# Altium footprint library Footprints_SOC.PcbLib: 194 footprints (part 3 of 13)
Each footprint in its own frame and in the unit in brackets; x right, y up, seen from the top. Pads: shape width x height; smd on the part's side, far side on the other; paste and mask are expansions set on the pad; w line width, h text height; cw(c..) or ccw(c..) is an arc to the next point about the centre after c.
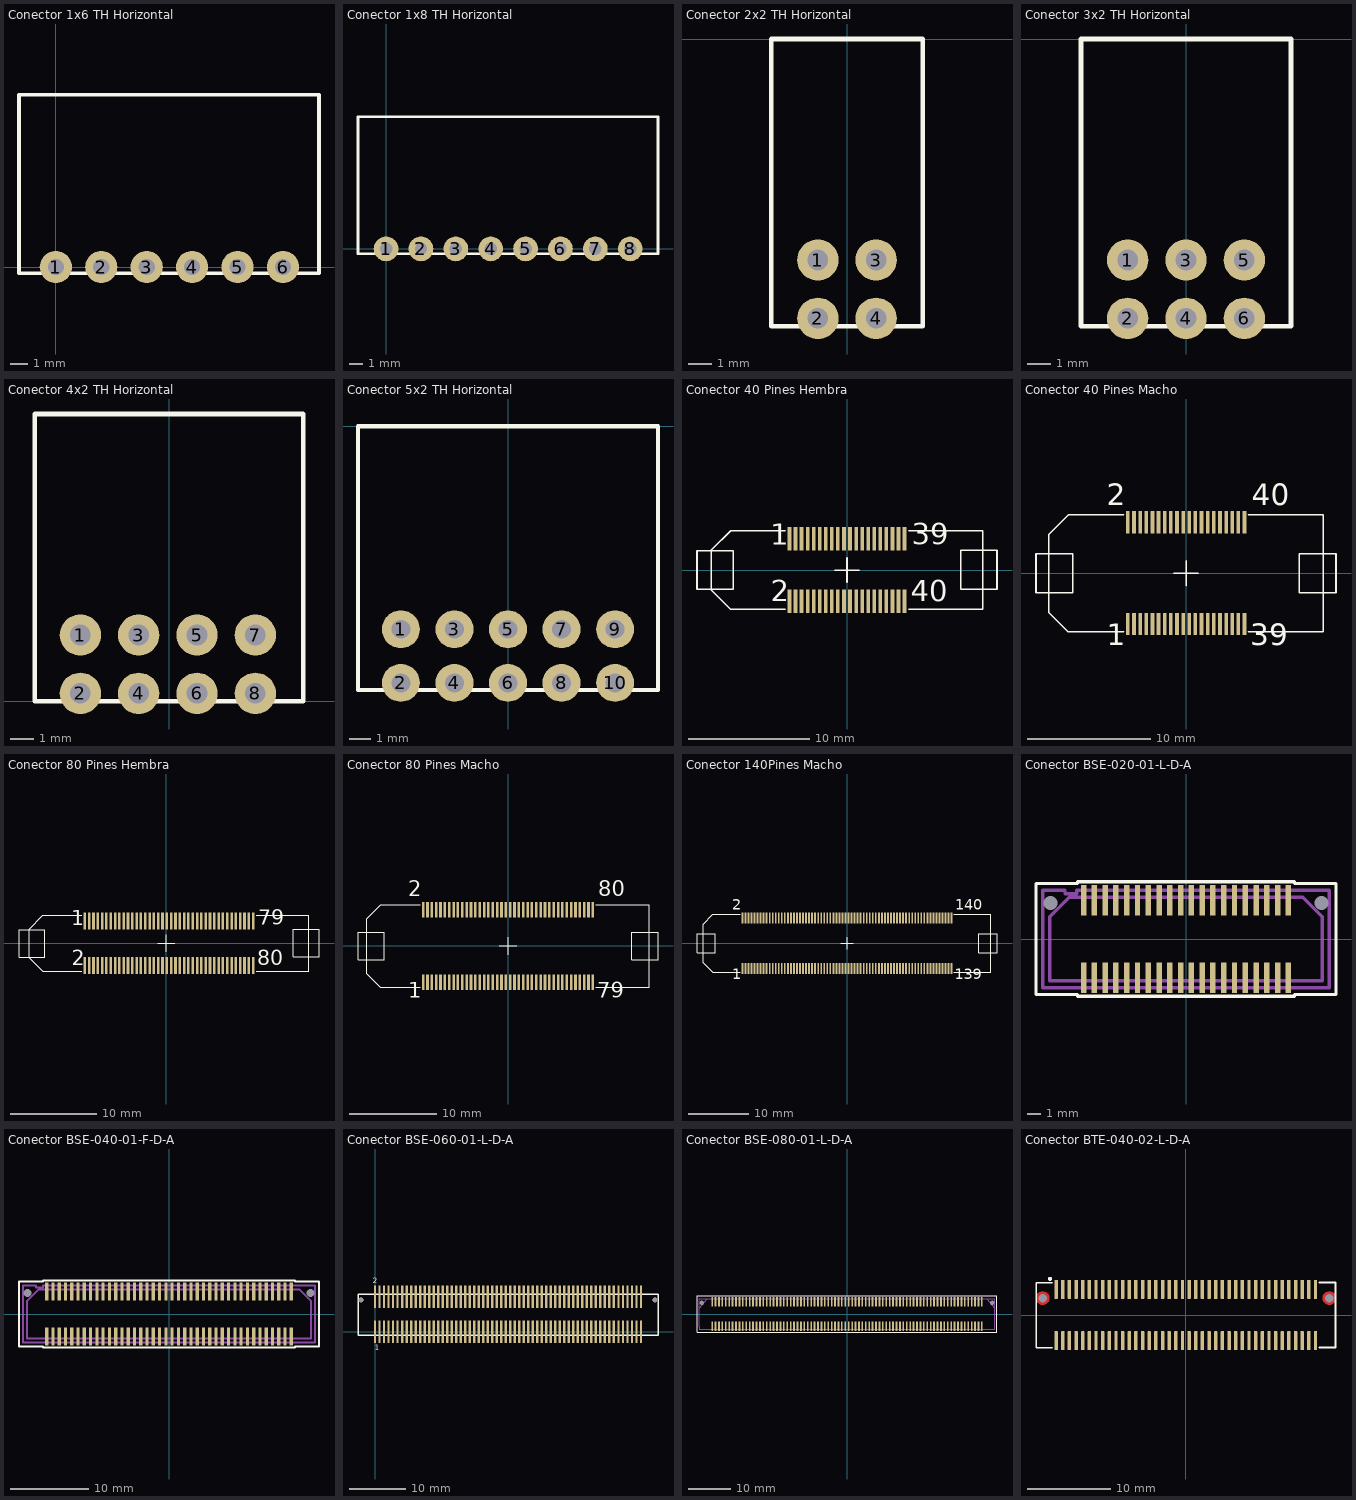
[diagram p2: the footprints below, top view; thin cyan lines are the x and y axes]

## Conector 1x6 TH Horizontal [mm] "Pitch 2.54mm P/N: IPL1-106-01-L-S-RA-K"
pads (6):
  round 1.8 hole 0.9 unplated: 1(0,0) 2(2.54,0) 3(5.08,0) 4(7.62,0) 5(10.16,0) 6(12.7,0)
Top Overlay:
  lines w0.2: -2.06,-0.345 -2.06,9.625 14.712,9.625 14.712,-0.345 -2.06,-0.345
3D body "Conector 1x6 TH Horizontal - IPL1-106-01-L-S-RA-K.stp": height 7.06, standoff -1.71, extent -2.052,-0.301 14.712,9.668

## Conector 1x8 TH Horizontal [mm] "Pitch 2.54mm P/N: IPL1-108-01-L-S-RA-K"
pads (8):
  round 1.8 hole 0.9 unplated: 1(0,0) 2(2.54,0) 3(5.08,0) 4(7.62,0) 5(10.16,0) 6(12.7,0) 7(15.24,0) 8(17.78,0)
Top Overlay:
  lines w0.2: -2.044,-0.345 -2.044,9.625 19.8,9.625 19.8,-0.345 -2.044,-0.345
3D body "Conector 1x8 TH Horizontal - IPL1-108-01-L-S-RA-K.stp": height 7.06, standoff -1.71, extent -2.044,-0.345 19.8,9.625

## Conector 2x2 TH Horizontal [mm] "Pitch 2.54mm P/N: IPL1-102-01-L-D-RA-K"
pads (4):
  round 1.8 hole 0.9: 1(-1.27,-9.628) 2(-1.27,-12.168) 3(1.27,-9.628) 4(1.27,-12.168)
Top Overlay:
  lines w0.2: -3.302,-12.509 3.302,-12.509 3.302,0 -3.302,0 -3.302,-12.509
3D body "Conector 2x2 TH Horizontal - IPL1-102-01-L-D-RA-K.stp": height 8.19, standoff -1.84, extent -3.302,-12.509 3.302,0

## Conector 3x2 TH Horizontal [mm] "Pitch 2.54mm P/N: IPL1-103-01-L-D-RA-K"
pads (6):
  round 1.8 hole 0.9: 1(-2.54,-9.628) 2(-2.54,-12.168) 3(0,-9.628) 4(0,-12.168) 5(2.54,-9.628) 6(2.54,-12.168)
Top Overlay:
  lines w0.2: -4.572,-12.509 -4.572,0 4.572,0 4.572,-12.509 -4.572,-12.509
3D body "Conector 3x2 TH Horizontal - IPL1-103-01-L-D-RA-K.stp": height 8.19, standoff -1.84, extent -4.572,-12.509 4.572,0

## Conector 4x2 TH Horizontal [mm] "Pitch 2.54mm P/N: IPL1-104-01-L-D-RA-K"
pads (8):
  round 1.8 hole 0.9: 1(-3.86,2.881) 2(-3.86,0.341) 3(-1.32,2.881) 4(-1.32,0.341) 5(1.22,2.881) 6(1.22,0.341) 7(3.76,2.881) 8(3.76,0.341)
Top Overlay:
  lines w0.2: -5.842,0 -5.842,12.509 5.842,12.509 5.842,0 -5.842,0
3D body "Conector 4x2 TH Horizontal - IPL1-104-01-L-D-RA-K.stp": height 8.19, standoff -1.84, extent -5.842,0 5.842,12.509

## Conector 5x2 TH Horizontal [mm] "Pitch 2.54mm P/N: IPL1-105-01-L-D-RA-K"
pads (10):
  round 1.8 hole 0.9 unplated: 1(-5.08,-9.628) 2(-5.08,-12.168) 3(-2.54,-9.628) 4(-2.54,-12.168) 5(0,-9.628) 6(0,-12.168) 7(2.54,-9.628) 8(2.54,-12.168) 9(5.08,-9.628) 10(5.08,-12.168)
Top Overlay:
  lines w0.2: -7.112,-12.509 7.112,-12.509 7.112,0 -7.112,0 -7.112,-12.509
3D body "Conector 5x2 TH Horizontal - IPL1-105-01-L-D-RA-K.stp": height 8.19, standoff -1.84, extent -7.112,-12.509 7.112,0

## Conector 40 Pines Hembra [mm] "SMD pitch 0.5mm 2 filas"
pads (40):
  rect 0.3x1.95 smd: 1(-4.75,2.575) 2(-4.75,-2.575) 3(-4.25,2.575) 4(-4.25,-2.575) 5(-3.75,2.575) 6(-3.75,-2.575) 7(-3.25,2.575) 8(-3.25,-2.575) 9(-2.75,2.575) 10(-2.75,-2.575) 11(-2.25,2.575) 12(-2.25,-2.575) 13(-1.75,2.575) 14(-1.75,-2.575) 15(-1.25,2.575) 16(-1.25,-2.575) 17(-0.75,2.575) 18(-0.75,-2.575) 19(-0.25,2.575) 20(-0.25,-2.575) 21(0.25,2.575) 22(0.25,-2.575) 23(0.75,2.575) 24(0.75,-2.575) 25(1.25,2.575) 26(1.25,-2.575) 27(1.75,2.575) 28(1.75,-2.575) 29(2.25,2.575) 30(2.25,-2.575) 31(2.75,2.575) 32(2.75,-2.575) 33(3.25,2.575) 34(3.25,-2.575) 35(3.75,2.575) 36(3.75,-2.575) 37(4.25,2.575) 38(4.25,-2.575) 39(4.75,2.575) 40(4.75,-2.575)
Top Overlay:
  lines w0.127: -5.1,-3.25 -9.6,-3.25 -11.2,-1.65 -11.2,1.649 -9.6,3.25 -5.1,3.25 ; -1,0 1,0 ; 0,-1 0,1 ; 5.1,-3.25 11.2,-3.25 11.2,3.25 5.1,3.25 ; -12.38,-1.6 -9.38,-1.6 -9.38,1.6 -12.38,1.6 -12.38,-1.6 ; 9.38,-1.58 9.38,1.62 12.38,1.62 12.38,-1.58 9.38,-1.58
  text "39" at 5.35,1.55 h3
  text "40" at 5.25,-3.138 h3
  text "2" at -6.28,-3.138 h3
  text "1" at -6.33,1.523 h3
  text "." at -5.53,3.54 h3
3D body "FX20-40S-0.5SV.stp": height 8.3, standoff 0, extent -11.185,-3.4 11.215,3.4

## Conector 40 Pines Macho [mm] "SMD pitch 0.5mm 2 filas"
pads (40):
  rect 0.3x1.8 smd: 1(-4.75,-4.15) 2(-4.75,4.15) 3(-4.25,-4.15) 4(-4.25,4.15) 5(-3.75,-4.15) 6(-3.75,4.15) 7(-3.25,-4.15) 8(-3.25,4.15) 9(-2.75,-4.15) 10(-2.75,4.15) 11(-2.25,-4.15) 12(-2.25,4.15) 13(-1.75,-4.15) 14(-1.75,4.15) 15(-1.25,-4.15) 16(-1.25,4.15) 17(-0.75,-4.15) 18(-0.75,4.15) 19(-0.25,-4.15) 20(-0.25,4.15) 21(0.25,-4.15) 22(0.25,4.15) 23(0.75,-4.15) 24(0.75,4.15) 25(1.25,-4.15) 26(1.25,4.15) 27(1.75,-4.15) 28(1.75,4.15) 29(2.25,-4.15) 30(2.25,4.15) 31(2.75,-4.15) 32(2.75,4.15) 33(3.25,-4.15) 34(3.25,4.15) 35(3.75,-4.15) 36(3.75,4.15) 37(4.25,-4.15) 38(4.25,4.15) 39(4.75,-4.15) 40(4.75,4.15)
Top Overlay:
  lines w0.127: -5.1,-4.75 -9.65,-4.75 -11.2,-3.2 -11.2,3.15 -9.6,4.75 -5.1,4.75 ; -1,0 1,0 ; 0,-1 0,1 ; 5.07,-4.75 11.17,-4.75 11.17,4.75 5.07,4.75 ; -12.23,-1.6 -9.23,-1.6 -9.23,1.6 -12.23,1.6 -12.23,-1.6 ; 9.2,-1.6 9.2,1.6 12.2,1.6 12.2,-1.6 9.2,-1.6
  text "40" at 5.32,4.95 h3
  text "39" at 5.22,-6.45 h3
  text "2" at -6.45,4.95 h3
  text "1" at -6.45,-6.45 h3
  text "." at -5.53,-5.25 h3
3D body "FX20-40P-0.5SV15.stp": height 13.2, standoff 0, extent -11.2,-4.75 11.2,4.75

## Conector 80 Pines Hembra [mm] "SMD pitch 0.5mm 2 filas"
pads (80):
  rect 0.3x1.95 smd: 1(-9.42,2.575) 2(-9.42,-2.575) 3(-8.92,2.575) 4(-8.92,-2.575) 5(-8.42,2.575) 6(-8.42,-2.575) 7(-7.92,2.575) 8(-7.92,-2.575) 9(-7.42,2.575) 10(-7.42,-2.575) 11(-6.92,2.575) 12(-6.92,-2.575) 13(-6.42,2.575) 14(-6.42,-2.575) 15(-5.92,2.575) 16(-5.92,-2.575) 17(-5.42,2.575) 18(-5.42,-2.575) 19(-4.92,2.575) 20(-4.92,-2.575) 21(-4.42,2.575) 22(-4.42,-2.575) 23(-3.92,2.575) 24(-3.92,-2.575) 25(-3.42,2.575) 26(-3.42,-2.575) 27(-2.92,2.575) 28(-2.92,-2.575) 29(-2.42,2.575) 30(-2.42,-2.575) 31(-1.92,2.575) 32(-1.92,-2.575) 33(-1.42,2.575) 34(-1.42,-2.575) 35(-0.92,2.575) 36(-0.92,-2.575) 37(-0.42,2.575) 38(-0.42,-2.575) 39(0.08,2.575) 40(0.08,-2.575) 41(0.58,2.575) 42(0.58,-2.575) 43(1.08,2.575) 44(1.08,-2.575) 45(1.58,2.575) 46(1.58,-2.575) 47(2.08,2.575) 48(2.08,-2.575) 49(2.58,2.575) 50(2.58,-2.575) 51(3.08,2.575) 52(3.08,-2.575) 53(3.58,2.575) 54(3.58,-2.575) 55(4.08,2.575) 56(4.08,-2.575) 57(4.58,2.575) 58(4.58,-2.575) 59(5.08,2.575) 60(5.08,-2.575) 61(5.58,2.575) 62(5.58,-2.575) 63(6.08,2.575) 64(6.08,-2.575) 65(6.58,2.575) 66(6.58,-2.575) 67(7.08,2.575) 68(7.08,-2.575) 69(7.58,2.575) 70(7.58,-2.575) 71(8.08,2.575) 72(8.08,-2.575) 73(8.58,2.575) 74(8.58,-2.575) 75(9.08,2.575) 76(9.08,-2.575) 77(9.58,2.575) 78(9.58,-2.575) 79(10.08,2.575) 80(10.08,-2.575)
Top Overlay:
  lines w0.127: -9.77,-3.25 -14.27,-3.25 -15.87,-1.65 -15.87,1.649 -14.27,3.25 -9.77,3.25 ; -1,0 1,0 ; 0.003,-1 0.003,1 ; 10.43,-3.25 16.53,-3.25 16.53,3.25 10.43,3.25 ; -17.05,-1.6 -17.05,1.6 -14.05,1.6 -14.05,-1.6 -17.05,-1.6 ; 14.71,-1.58 17.71,-1.58 17.71,1.62 14.71,1.62 14.71,-1.58
  text "." at -10.2,3.54 h3
  text "1" at -11,1.523 h3
  text "2" at -10.95,-3.138 h3
  text "80" at 10.58,-3.138 h3
  text "79" at 10.68,1.55 h3
3D body "FX20-80S-0.5SV.stp": height 8.3, standoff 0, extent -15.87,-3.4 16.53,3.4

## Conector 80 Pines Macho [mm] "SMD pitch 0.5mm 2 filas"
pads (80):
  rect 0.3x1.8 smd: 1(-9.75,-4.15) 2(-9.75,4.15) 3(-9.25,-4.15) 4(-9.25,4.15) 5(-8.75,-4.15) 6(-8.75,4.15) 7(-8.25,-4.15) 8(-8.25,4.15) 9(-7.75,-4.15) 10(-7.75,4.15) 11(-7.25,-4.15) 12(-7.25,4.15) 13(-6.75,-4.15) 14(-6.75,4.15) 15(-6.25,-4.15) 16(-6.25,4.15) 17(-5.75,-4.15) 18(-5.75,4.15) 19(-5.25,-4.15) 20(-5.25,4.15) 21(-4.75,-4.15) 22(-4.75,4.15) 23(-4.25,-4.15) 24(-4.25,4.15) 25(-3.75,-4.15) 26(-3.75,4.15) 27(-3.25,-4.15) 28(-3.25,4.15) 29(-2.75,-4.15) 30(-2.75,4.15) 31(-2.25,-4.15) 32(-2.25,4.15) 33(-1.75,-4.15) 34(-1.75,4.15) 35(-1.25,-4.15) 36(-1.25,4.15) 37(-0.75,-4.15) 38(-0.75,4.15) 39(-0.25,-4.15) 40(-0.25,4.15) 41(0.25,-4.15) 42(0.25,4.15) 43(0.75,-4.15) 44(0.75,4.15) 45(1.25,-4.15) 46(1.25,4.15) 47(1.75,-4.15) 48(1.75,4.15) 49(2.25,-4.15) 50(2.25,4.15) 51(2.75,-4.15) 52(2.75,4.15) 53(3.25,-4.15) 54(3.25,4.15) 55(3.75,-4.15) 56(3.75,4.15) 57(4.25,-4.15) 58(4.25,4.15) 59(4.75,-4.15) 60(4.75,4.15) 61(5.25,-4.15) 62(5.25,4.15) 63(5.75,-4.15) 64(5.75,4.15) 65(6.25,-4.15) 66(6.25,4.15) 67(6.75,-4.15) 68(6.75,4.15) 69(7.25,-4.15) 70(7.25,4.15) 71(7.75,-4.15) 72(7.75,4.15) 73(8.25,-4.15) 74(8.25,4.15) 75(8.75,-4.15) 76(8.75,4.15) 77(9.25,-4.15) 78(9.25,4.15) 79(9.75,-4.15) 80(9.75,4.15)
Top Overlay:
  lines w0.127: -10.1,-4.75 -14.65,-4.75 -16.2,-3.2 -16.2,3.15 -14.6,4.75 -10.1,4.75 ; -1,0 1,0 ; 0,-1 0,1 ; 10.1,-4.75 16.2,-4.75 16.2,4.75 10.1,4.75 ; -17.23,-1.6 -14.23,-1.6 -14.23,1.6 -17.23,1.6 -17.23,-1.6 ; 14.23,-1.6 14.23,1.6 17.23,1.6 17.23,-1.6 14.23,-1.6
  text "80" at 10.35,5.15 h3
  text "79" at 10.25,-6.55 h3
  text "2" at -11.45,5.15 h3
  text "1" at -11.45,-6.55 h3
  text "." at -10.53,-5.25 h3
3D body "FX20-80P-0.5SV15.stp": height 13.2, standoff 0, extent -16.19,-4.75 16.21,4.75

## Conector 140Pines Macho [mm] "SMD pitch 0.5mm 2 filas"
pads (140):
  rect 0.3x1.8 smd: 1(-17.25,-4.15) 2(-17.25,4.15) 3(-16.75,-4.15) 4(-16.75,4.15) 5(-16.25,-4.15) 6(-16.25,4.15) 7(-15.75,-4.15) 8(-15.75,4.15) 9(-15.25,-4.15) 10(-15.25,4.15) 11(-14.75,-4.15) 12(-14.75,4.15) 13(-14.25,-4.15) 14(-14.25,4.15) 15(-13.75,-4.15) 16(-13.75,4.15) 17(-13.25,-4.15) 18(-13.25,4.15) 19(-12.75,-4.15) 20(-12.75,4.15) 21(-12.25,-4.15) 22(-12.25,4.15) 23(-11.75,-4.15) 24(-11.75,4.15) 25(-11.25,-4.15) 26(-11.25,4.15) 27(-10.75,-4.15) 28(-10.75,4.15) 29(-10.25,-4.15) 30(-10.25,4.15) 31(-9.75,-4.15) 32(-9.75,4.15) 33(-9.25,-4.15) 34(-9.25,4.15) 35(-8.75,-4.15) 36(-8.75,4.15) 37(-8.25,-4.15) 38(-8.25,4.15) 39(-7.75,-4.15) 40(-7.75,4.15) 41(-7.25,-4.15) 42(-7.25,4.15) 43(-6.75,-4.15) 44(-6.75,4.15) 45(-6.25,-4.15) 46(-6.25,4.15) 47(-5.75,-4.15) 48(-5.75,4.15) 49(-5.25,-4.15) 50(-5.25,4.15) 51(-4.75,-4.15) 52(-4.75,4.15) 53(-4.25,-4.15) 54(-4.25,4.15) 55(-3.75,-4.15) 56(-3.75,4.15) 57(-3.25,-4.15) 58(-3.25,4.15) 59(-2.75,-4.15) 60(-2.75,4.15) 61(-2.25,-4.15) 62(-2.25,4.15) 63(-1.75,-4.15) 64(-1.75,4.15) 65(-1.25,-4.15) 66(-1.25,4.15) 67(-0.75,-4.15) 68(-0.75,4.15) 69(-0.25,-4.15) 70(-0.25,4.15) 71(0.25,-4.15) 72(0.25,4.15) 73(0.75,-4.15) 74(0.75,4.15) 75(1.25,-4.15) 76(1.25,4.15) 77(1.75,-4.15) 78(1.75,4.15) 79(2.25,-4.15) 80(2.25,4.15) 81(2.75,-4.15) 82(2.75,4.15) 83(3.25,-4.15) 84(3.25,4.15) 85(3.75,-4.15) 86(3.75,4.15) 87(4.25,-4.15) 88(4.25,4.15) 89(4.75,-4.15) 90(4.75,4.15) 91(5.25,-4.15) 92(5.25,4.15) 93(5.75,-4.15) 94(5.75,4.15) 95(6.25,-4.15) 96(6.25,4.15) 97(6.75,-4.15) 98(6.75,4.15) 99(7.25,-4.15) 100(7.25,4.15) 101(7.75,-4.15) 102(7.75,4.15) 103(8.25,-4.15) 104(8.25,4.15) 105(8.75,-4.15) 106(8.75,4.15) 107(9.25,-4.15) 108(9.25,4.15) 109(9.75,-4.15) 110(9.75,4.15) 111(10.25,-4.15) 112(10.25,4.15) 113(10.75,-4.15) 114(10.75,4.15) 115(11.25,-4.15) 116(11.25,4.15) 117(11.75,-4.15) 118(11.75,4.15) 119(12.25,-4.15) 120(12.25,4.15) 121(12.75,-4.15) 122(12.75,4.15) 123(13.25,-4.15) 124(13.25,4.15) 125(13.75,-4.15) 126(13.75,4.15) 127(14.25,-4.15) 128(14.25,4.15) 129(14.75,-4.15) 130(14.75,4.15) 131(15.25,-4.15) 132(15.25,4.15) 133(15.75,-4.15) 134(15.75,4.15) 135(16.25,-4.15) 136(16.25,4.15) 137(16.75,-4.15) 138(16.75,4.15) 139(17.25,-4.15) 140(17.25,4.15)
Top Overlay:
  lines w0.127: -17.6,-4.75 -22.15,-4.75 -23.7,-3.2 -23.7,3.15 -22.1,4.75 -17.6,4.75 ; 17.6,-4.75 23.7,-4.75 23.7,4.75 17.6,4.75 ; -24.73,-1.6 -24.73,1.6 -21.73,1.6 -21.73,-1.6 -24.73,-1.6 ; 21.73,-1.6 24.73,-1.6 24.73,1.6 21.73,1.6 21.73,-1.6
  lines w0.2: -1,0 1,0 ; 0,-1 0,1
  text "." at -18.05,-4.35 h3
  text "1" at -18.95,-6.55 h3
  text "2" at -18.95,4.95 h3
  text "139" at 17.75,-6.55 h3
  text "140" at 17.85,4.95 h3
3D body "FX20-140P-0.5SV15.stp": height 13.2, standoff 0, extent -23.7,-4.75 23.7,4.75

## Conector BSE-020-01-L-D-A [mm] "Conector Samtec de 40 pines Pitch 0.8mm Macho"
pads (42):
  rect 0.406x2.273 smd mask+0.05: 1(-7.6,-2.864) 2(-7.6,2.864) 3(-6.8,-2.864) 4(-6.8,2.864) 5(-6,-2.864) 6(-6,2.864) 7(-5.2,-2.864) 8(-5.2,2.864) 9(-4.4,-2.864) 10(-4.4,2.864) 11(-3.6,-2.864) 12(-3.6,2.864) 13(-2.8,-2.864) 14(-2.8,2.864) 15(-2,-2.864) 16(-2,2.864) 17(-1.2,-2.864) 18(-1.2,2.864) 19(-0.4,-2.864) 20(-0.4,2.864) 21(0.4,-2.864) 22(0.4,2.864) 23(1.2,-2.864) 24(1.2,2.864) 25(2,-2.864) 26(2,2.864) 27(2.8,-2.864) 28(2.8,2.864) 29(3.6,-2.864) 30(3.6,2.864) 31(4.4,-2.864) 32(4.4,2.864) 33(5.2,-2.864) 34(5.2,2.864) 35(6,-2.864) 36(6,2.864) 37(6.8,-2.864) 38(6.8,2.864) 39(7.6,-2.864) 40(7.6,2.864)
  round 0.8 hole 1.016 unplated mask+0.358: ""(-10.064,2.67) ""(10.064,2.67)
Top Overlay:
  lines w0.254: -11.135,-4.119 -11.135,4.119 -8.057,4.119 -8.057,4.255 8.057,4.255 8.057,4.119 11.135,4.119 11.135,-4.119 8.057,-4.119 8.057,-4.255 -8.057,-4.255 -8.057,-4.119 -11.135,-4.119
Mechanical 1:
  lines w0.254: -10.635,-3.619 -10.635,3.619 -8.984,3.619 -8.984,3.365 -8.095,3.365 -8.095,3.619 10.635,3.619 10.635,-3.619 -10.635,-3.619 ; -10.127,-3.111 -10.127,1.638 -8.654,3.111 8.654,3.111 10.127,1.638 10.127,-3.111 -10.127,-3.111
3D body "BSE-020-01-L-D-A.stp": height 3.25, standoff -0.75, extent -10.637,-3.746 10.636,3.747

## Conector BSE-040-01-F-D-A [mm] "Conector Samtec de 80 pines Pitch 0.8mm Macho"
pads (82):
  rect 0.406x2.273 smd mask+0.05: 1(-15.6,-2.864) 2(-15.6,2.864) 3(-14.8,-2.864) 4(-14.8,2.864) 5(-14,-2.864) 6(-14,2.864) 7(-13.2,-2.864) 8(-13.2,2.864) 9(-12.4,-2.864) 10(-12.4,2.864) 11(-11.6,-2.864) 12(-11.6,2.864) 13(-10.8,-2.864) 14(-10.8,2.864) 15(-10,-2.864) 16(-10,2.864) 17(-9.2,-2.864) 18(-9.2,2.864) 19(-8.4,-2.864) 20(-8.4,2.864) 21(-7.6,-2.864) 22(-7.6,2.864) 23(-6.8,-2.864) 24(-6.8,2.864) 25(-6,-2.864) 26(-6,2.864) 27(-5.2,-2.864) 28(-5.2,2.864) 29(-4.4,-2.864) 30(-4.4,2.864) 31(-3.6,-2.864) 32(-3.6,2.864) 33(-2.8,-2.864) 34(-2.8,2.864) 35(-2,-2.864) 36(-2,2.864) 37(-1.2,-2.864) 38(-1.2,2.864) 39(-0.4,-2.864) 40(-0.4,2.864) 41(0.4,-2.864) 42(0.4,2.864) 43(1.2,-2.864) 44(1.2,2.864) 45(2,-2.864) 46(2,2.864) 47(2.8,-2.864) 48(2.8,2.864) 49(3.6,-2.864) 50(3.6,2.864) 51(4.4,-2.864) 52(4.4,2.864) 53(5.2,-2.864) 54(5.2,2.864) 55(6,-2.864) 56(6,2.864) 57(6.8,-2.864) 58(6.8,2.864) 59(7.6,-2.864) 60(7.6,2.864) 61(8.4,-2.864) 62(8.4,2.864) 63(9.2,-2.864) 64(9.2,2.864) 65(10,-2.864) 66(10,2.864) 67(10.8,-2.864) 68(10.8,2.864) 69(11.6,-2.864) 70(11.6,2.864) 71(12.4,-2.864) 72(12.4,2.864) 73(13.2,-2.864) 74(13.2,2.864) 75(14,-2.864) 76(14,2.864) 77(14.8,-2.864) 78(14.8,2.864) 79(15.6,-2.864) 80(15.6,2.864)
  round 0.8 hole 1.016 unplated mask+0.358: ""(-18.063,2.67) ""(18.063,2.67)
Top Overlay:
  lines w0.254: -19.135,-4.119 -16.057,-4.119 -16.057,-4.255 16.057,-4.255 16.057,-4.119 19.135,-4.119 19.135,4.119 16.057,4.119 16.057,4.255 -16.057,4.255 -16.057,4.119 -19.135,4.119 -19.135,-4.119
Mechanical 1:
  lines w0.254: -18.635,-3.619 18.635,-3.619 18.635,3.619 -16.095,3.619 -16.095,3.365 -16.984,3.365 -16.984,3.619 -18.635,3.619 -18.635,-3.619 ; -18.127,-3.111 18.127,-3.111 18.127,1.638 16.654,3.111 -16.654,3.111 -18.127,1.638 -18.127,-3.111
3D body "BSE-040-01-F-D-A.stp": height 3.25, standoff -0.75, extent -18.638,-3.746 18.637,3.747

## Conector BSE-060-01-L-D-A [mm] "Hembra"
pads (122):
  rect 0.4x4 smd: 1(0,0) 2(0,6.223) 3(0.8,0) 4(0.8,6.223) 5(1.6,0) 6(1.6,6.223) 7(2.4,0) 8(2.4,6.223) 9(3.2,0) 10(3.2,6.223) 11(4,0) 12(4,6.223) 13(4.8,0) 14(4.8,6.223) 15(5.6,0) 16(5.6,6.223) 17(6.4,0) 18(6.4,6.223) 19(7.2,0) 20(7.2,6.223) 21(8,0) 22(8,6.223) 23(8.8,0) 24(8.8,6.223) 25(9.6,0) 26(9.6,6.223) 27(10.4,0) 28(10.4,6.223) 29(11.2,0) 30(11.2,6.223) 31(12,0) 32(12,6.223) 33(12.8,0) 34(12.8,6.223) 35(13.6,0) 36(13.6,6.223) 37(14.4,0) 38(14.4,6.223) 39(15.2,0) 40(15.2,6.223) 41(16,0) 42(16,6.223) 43(16.8,0) 44(16.8,6.223) 45(17.6,0) 46(17.6,6.223) 47(18.4,0) 48(18.4,6.223) 49(19.2,0) 50(19.2,6.223) 51(20,0) 52(20,6.223) 53(20.8,0) 54(20.8,6.223) 55(21.6,0) 56(21.6,6.223) 57(22.4,0) 58(22.4,6.223) 59(23.2,0) 60(23.2,6.223) 61(24,0) 62(24,6.223) 63(24.8,0) 64(24.8,6.223) 65(25.6,0) 66(25.6,6.223) 67(26.4,0) 68(26.4,6.223) 69(27.2,0) 70(27.2,6.223) 71(28,0) 72(28,6.223) 73(28.8,0) 74(28.8,6.223) 75(29.6,0) 76(29.6,6.223) 77(30.4,0) 78(30.4,6.223) 79(31.2,0) 80(31.2,6.223) 81(32,0) 82(32,6.223) 83(32.8,0) 84(32.8,6.223) 85(33.6,0) 86(33.6,6.223) 87(34.4,0) 88(34.4,6.223) 89(35.2,0) 90(35.2,6.223) 91(36,0) 92(36,6.223) 93(36.8,0) 94(36.8,6.223) 95(37.6,0) 96(37.6,6.223) 97(38.4,0) 98(38.4,6.223) 99(39.2,0) 100(39.2,6.223) 101(40,0) 102(40,6.223) 103(40.8,0) 104(40.8,6.223) 105(41.6,0) 106(41.6,6.223) 107(42.4,0) 108(42.4,6.223) 109(43.2,0) 110(43.2,6.223) 111(44,0) 112(44,6.223) 113(44.8,0) 114(44.8,6.223) 115(45.6,0) 116(45.6,6.223) 117(46.4,0) 118(46.4,6.223) 119(47.2,0) 120(47.2,6.223)
  round 0.8 hole 0.9: ""(-2.465,5.67) ""(49.665,5.67)
Top Overlay:
  lines w0.254: -3.035,-0.616 -3.035,6.623 50.235,6.623 50.235,-0.616 -3.035,-0.616
  text "2" at -0.4,8.6 h1
  text "1" at -0.1,-3.3 h1
3D body "BSE-060-01-L-D-A-TR.stp": height 3.25, standoff -0.75, extent -3,-0.793 50.277,6.7

## Conector BSE-080-01-L-D-A [mil] "Conector Samtec de 160 pines Pitch 0.8mm"
pads (162):
  rect 16x89.5 smd mask+2: 1(-1244.25,-112.75) 2(-1244.25,112.75) 3(-1212.75,-112.75) 4(-1212.75,112.75) 5(-1181.25,-112.75) 6(-1181.25,112.75) 7(-1149.75,-112.75) 8(-1149.75,112.75) 9(-1118.25,-112.75) 10(-1118.25,112.75) 11(-1086.75,-112.75) 12(-1086.75,112.75) 13(-1055.25,-112.75) 14(-1055.25,112.75) 15(-1023.75,-112.75) 16(-1023.75,112.75) 17(-992.25,-112.75) 18(-992.25,112.75) 19(-960.75,-112.75) 20(-960.75,112.75) 21(-929.25,-112.75) 22(-929.25,112.75) 23(-897.75,-112.75) 24(-897.75,112.75) 25(-866.25,-112.75) 26(-866.25,112.75) 27(-834.75,-112.75) 28(-834.75,112.75) 29(-803.25,-112.75) 30(-803.25,112.75) 31(-771.75,-112.75) 32(-771.75,112.75) 33(-740.25,-112.75) 34(-740.25,112.75) 35(-708.75,-112.75) 36(-708.75,112.75) 37(-677.25,-112.75) 38(-677.25,112.75) 39(-645.75,-112.75) 40(-645.75,112.75) 41(-614.25,-112.75) 42(-614.25,112.75) 43(-582.75,-112.75) 44(-582.75,112.75) 45(-551.25,-112.75) 46(-551.25,112.75) 47(-519.75,-112.75) 48(-519.75,112.75) 49(-488.25,-112.75) 50(-488.25,112.75) 51(-456.75,-112.75) 52(-456.75,112.75) 53(-425.25,-112.75) 54(-425.25,112.75) 55(-393.75,-112.75) 56(-393.75,112.75) 57(-362.25,-112.75) 58(-362.25,112.75) 59(-330.75,-112.75) 60(-330.75,112.75) 61(-299.25,-112.75) 62(-299.25,112.75) 63(-267.75,-112.75) 64(-267.75,112.75) 65(-236.25,-112.75) 66(-236.25,112.75) 67(-204.75,-112.75) 68(-204.75,112.75) 69(-173.25,-112.75) 70(-173.25,112.75) 71(-141.75,-112.75) 72(-141.75,112.75) 73(-110.25,-112.75) 74(-110.25,112.75) 75(-78.75,-112.75) 76(-78.75,112.75) 77(-47.25,-112.75) 78(-47.25,112.75) 79(-15.75,-112.75) 80(-15.75,112.75) 81(15.75,-112.75) 82(15.75,112.75) 83(47.25,-112.75) 84(47.25,112.75) 85(78.75,-112.75) 86(78.75,112.75) 87(110.25,-112.75) 88(110.25,112.75) 89(141.75,-112.75) 90(141.75,112.75) 91(173.25,-112.75) 92(173.25,112.75) 93(204.75,-112.75) 94(204.75,112.75) 95(236.25,-112.75) 96(236.25,112.75) 97(267.75,-112.75) 98(267.75,112.75) 99(299.25,-112.75) 100(299.25,112.75) 101(330.75,-112.75) 102(330.75,112.75) 103(362.25,-112.75) 104(362.25,112.75) 105(393.75,-112.75) 106(393.75,112.75) 107(425.25,-112.75) 108(425.25,112.75) 109(456.75,-112.75) 110(456.75,112.75) 111(488.25,-112.75) 112(488.25,112.75) 113(519.75,-112.75) 114(519.75,112.75) 115(551.25,-112.75) 116(551.25,112.75) 117(582.75,-112.75) 118(582.75,112.75) 119(614.25,-112.75) 120(614.25,112.75) 121(645.75,-112.75) 122(645.75,112.75) 123(677.25,-112.75) 124(677.25,112.75) 125(708.75,-112.75) 126(708.75,112.75) 127(740.25,-112.75) 128(740.25,112.75) 129(771.75,-112.75) 130(771.75,112.75) 131(803.25,-112.75) 132(803.25,112.75) 133(834.75,-112.75) 134(834.75,112.75) 135(866.25,-112.75) 136(866.25,112.75) 137(897.75,-112.75) 138(897.75,112.75) 139(929.25,-112.75) 140(929.25,112.75) 141(960.75,-112.75) 142(960.75,112.75) 143(992.25,-112.75) 144(992.25,112.75) 145(1023.75,-112.75) 146(1023.75,112.75) 147(1055.25,-112.75) 148(1055.25,112.75) 149(1086.75,-112.75) 150(1086.75,112.75) 151(1118.25,-112.75) 152(1118.25,112.75) 153(1149.75,-112.75) 154(1149.75,112.75) 155(1181.25,-112.75) 156(1181.25,112.75) 157(1212.75,-112.75) 158(1212.75,112.75) 159(1244.25,-112.75) 160(1244.25,112.75)
  round 20 hole 40 unplated mask+20: 161(-1341.25,105) 162(1341.25,105)
Top Overlay:
  lines w10: -1383.75,-167.5 1383.75,-167.5 1383.75,167.5 -1383.75,167.5 -1383.75,-167.5
Mechanical 1:
  lines w10: -1363.5,51.7 -1289,142.5 ; 1289,142.5 1363.5,51.7 ; -1363.75,-116.55 -1363.55,-142.5 1363.75,-142.5 1363.75,142.5 -1363.75,142.5 -1363.75,-116.55
3D body "BSE-080-01-L-D-A.stp": height 128, standoff -29.5, extent -1363.76,-147.49 1363.74,147.51

## Conector BTE-040-02-L-D-A [mm] "Conector Samtec 80 pines hembra altura 8mm pitch 0.8mm"
height 16
pads (82):
  rrect20% 0.41x2.273 smd: 1(-15.6,3.086) 2(-15.6,-3.086) 3(-14.8,3.086) 4(-14.8,-3.086) 5(-14,3.086) 6(-14,-3.086) 7(-13.2,3.086) 8(-13.2,-3.086) 9(-12.4,3.086) 10(-12.4,-3.086) 11(-11.6,3.086) 12(-11.6,-3.086) 13(-10.8,3.086) 14(-10.8,-3.086) 15(-10,3.086) 16(-10,-3.086) 17(-9.2,3.086) 18(-9.2,-3.086) 19(-8.4,3.086) 20(-8.4,-3.086) 21(-7.6,3.086) 22(-7.6,-3.086) 23(-6.8,3.086) 24(-6.8,-3.086) 25(-6,3.086) 26(-6,-3.086) 27(-5.2,3.086) 28(-5.2,-3.086) 29(-4.4,3.086) 30(-4.4,-3.086) 31(-3.6,3.086) 32(-3.6,-3.086) 33(-2.8,3.086) 34(-2.8,-3.086) 35(-2,3.086) 36(-2,-3.086) 37(-1.2,3.086) 38(-1.2,-3.086) 39(-0.4,3.086) 40(-0.4,-3.086) 41(0.4,3.086) 42(0.4,-3.086) 43(1.2,3.086) 44(1.2,-3.086) 45(2,3.086) 46(2,-3.086) 47(2.8,3.086) 48(2.8,-3.086) 49(3.6,3.086) 50(3.6,-3.086) 51(4.4,3.086) 52(4.4,-3.086) 53(5.2,3.086) 54(5.2,-3.086) 55(6,3.086) 56(6,-3.086) 57(6.8,3.086) 58(6.8,-3.086) 59(7.6,3.086) 60(7.6,-3.086) 61(8.4,3.086) 62(8.4,-3.086) 63(9.2,3.086) 64(9.2,-3.086) 65(10,3.086) 66(10,-3.086) 67(10.8,3.086) 68(10.8,-3.086) 69(11.6,3.086) 70(11.6,-3.086) 71(12.4,3.086) 72(12.4,-3.086) 73(13.2,3.086) 74(13.2,-3.086) 75(14,3.086) 76(14,-3.086) 77(14.8,3.086) 78(14.8,-3.086) 79(15.6,3.086) 80(15.6,-3.086)
  round 0.5 hole 1.02 unplated mask+0: ""(-17.238,2.032) ""(17.238,2.032)
Top Layer:
  pour cut-out: -16.409,2.027 -16.436,2.236 -16.517,2.43 -16.645,2.597 -16.812,2.726 -17.007,2.806 -17.216,2.834 -17.424,2.806 -17.619,2.726 -17.786,2.597 -17.914,2.43 -17.995,2.236 -18.022,2.027 -17.995,1.818 -17.914,1.623 -17.786,1.456 -17.619,1.328 -17.424,1.247 -17.216,1.22 -17.007,1.247 -16.812,1.328 -16.645,1.456 -16.517,1.623 -16.436,1.818
  pour cut-out: 18.065,2.043 18.037,2.252 17.956,2.446 17.828,2.613 17.661,2.742 17.466,2.822 17.258,2.85 17.049,2.822 16.854,2.742 16.687,2.613 16.559,2.446 16.478,2.252 16.451,2.043 16.478,1.834 16.559,1.639 16.687,1.472 16.854,1.344 17.049,1.263 17.258,1.236 17.466,1.263 17.661,1.344 17.828,1.472 17.956,1.639 18.037,1.834
Top Overlay:
  circle w0.25: c-16.34,4.346 r0.125
  lines w0.2: -16.05,-3.95 -18.002,-3.95 -18.002,3.9 -16.05,3.9 ; 16.05,-3.9 18.002,-3.9 18.002,3.92 16.05,3.92
3D body "BTE-040-02-L-D-A.stp": height 7.27, standoff -0.75, extent -18.002,-3.556 18.002,3.556